# Altium footprint library LongMen.PcbLib: 245 footprints (part 7 of 16)
Each footprint in its own frame and in the unit in brackets; x right, y up, seen from the top. Pads: shape width x height; smd on the part's side, far side on the other; paste and mask are expansions set on the pad; w line width, h text height; cw(c..) or ccw(c..) is an arc to the next point about the centre after c.
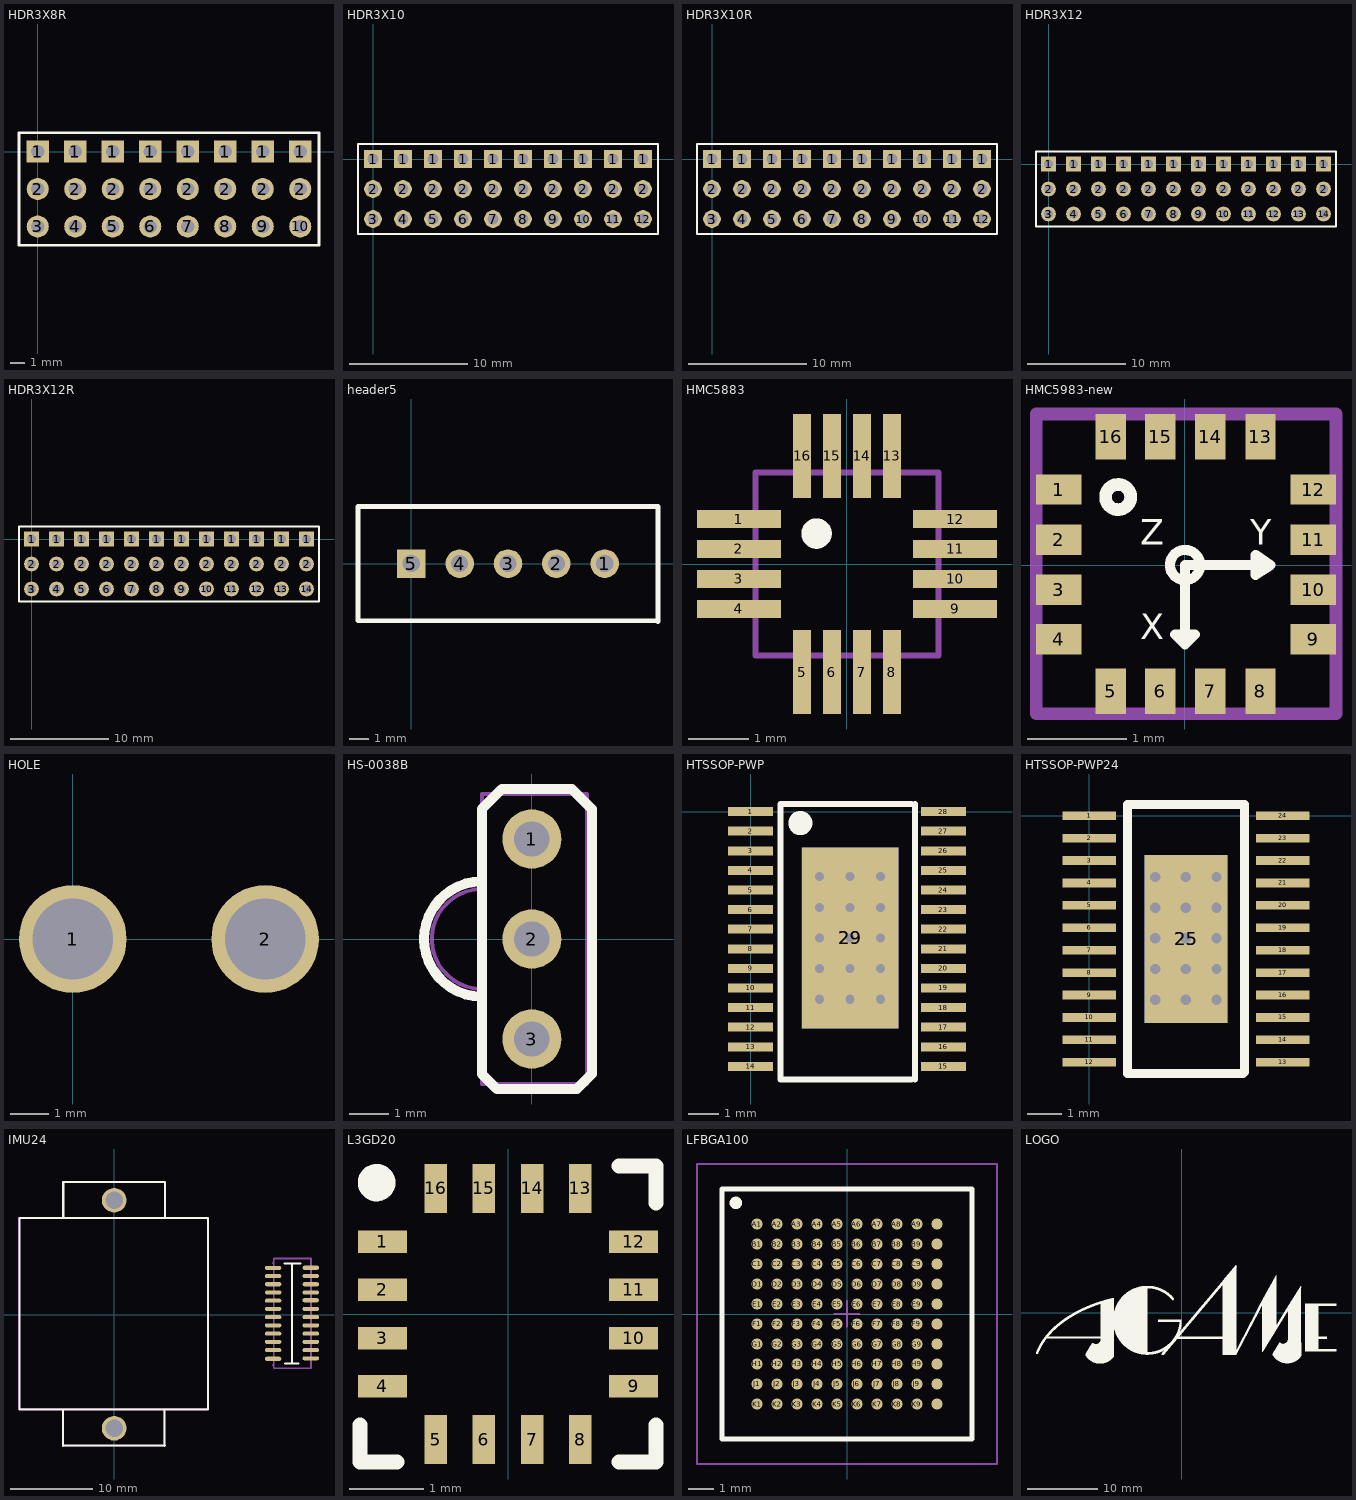
[diagram p6: the footprints below, top view; thin cyan lines are the x and y axes]

## HDR3X8R [mm]
pads (24):
  rect 1.5x1.5 hole 0.9: 1(0,0) 1(2.54,0) 1(5.08,0) 1(7.62,0) 1(10.16,0) 1(12.7,0) 1(15.24,0) 1(17.78,0)
  round 1.5 hole 0.9: 2(0,-2.54) 2(2.54,-2.54) 2(5.08,-2.54) 2(7.62,-2.54) 2(10.16,-2.54) 2(12.7,-2.54) 2(15.24,-2.54) 2(17.78,-2.54) 3(0,-5.08) 4(2.54,-5.08) 5(5.08,-5.08) 6(7.62,-5.08) 7(10.16,-5.08) 8(12.7,-5.08) 9(15.24,-5.08) 10(17.78,-5.08)
Top Overlay:
  lines w0.2: -1.27,-6.35 19.05,-6.35 19.05,1.27 -1.27,1.27 -1.27,-6.35
Mechanical 16:
  lines w0.1: -0.3,-5.38 -0.3,-4.78 0.3,-4.78 0.3,-5.38 -0.3,-5.38 ; -0.3,-2.84 -0.3,-2.24 0.3,-2.24 0.3,-2.84 -0.3,-2.84 ; -0.3,-0.3 0.3,-0.3 0.3,0.3 -0.3,0.3 -0.3,-0.3 ; 2.24,-5.38 2.24,-4.78 2.84,-4.78 2.84,-5.38 2.24,-5.38 ; 2.24,-2.84 2.24,-2.24 2.84,-2.24 2.84,-2.84 2.24,-2.84 ; 2.24,-0.3 2.24,0.3 2.84,0.3 2.84,-0.3 2.24,-0.3 ; 4.78,-5.38 5.38,-5.38 5.38,-4.78 4.78,-4.78 4.78,-5.38 ; 4.78,-2.84 5.38,-2.84 5.38,-2.24 4.78,-2.24 4.78,-2.84 ; 4.78,-0.3 4.78,0.3 5.38,0.3 5.38,-0.3 4.78,-0.3 ; 7.32,-5.38 7.92,-5.38 7.92,-4.78 7.32,-4.78 7.32,-5.38 ; 7.32,-2.84 7.92,-2.84 7.92,-2.24 7.32,-2.24 7.32,-2.84 ; 7.32,-0.3 7.32,0.3 7.92,0.3 7.92,-0.3 7.32,-0.3 ; 9.86,-5.38 10.46,-5.38 10.46,-4.78 9.86,-4.78 9.86,-5.38 ; 9.86,-2.84 10.46,-2.84 10.46,-2.24 9.86,-2.24 9.86,-2.84 ; 9.86,-0.3 9.86,0.3 10.46,0.3 10.46,-0.3 9.86,-0.3 ; 12.4,-5.38 13,-5.38 13,-4.78 12.4,-4.78 12.4,-5.38 ; 12.4,-2.84 13,-2.84 13,-2.24 12.4,-2.24 12.4,-2.84 ; 12.4,-0.3 13,-0.3 13,0.3 12.4,0.3 12.4,-0.3 ; 14.94,-5.38 14.94,-4.78 15.54,-4.78 15.54,-5.38 14.94,-5.38 ; 14.94,-2.84 14.94,-2.24 15.54,-2.24 15.54,-2.84 14.94,-2.84 ; 14.94,-0.3 15.54,-0.3 15.54,0.3 14.94,0.3 14.94,-0.3 ; 17.48,-5.38 17.48,-4.78 18.08,-4.78 18.08,-5.38 17.48,-5.38 ; 17.48,-2.84 17.48,-2.24 18.08,-2.24 18.08,-2.84 17.48,-2.84 ; 17.48,-0.3 18.08,-0.3 18.08,0.3 17.48,0.3 17.48,-0.3
3D body: height 7.59, standoff -3, extent -1.27,-5.4 19.05,9.81

## HDR3X10 [mm]
pads (31):
  rect 1.5x1.5 hole 0.9: 1(0,0) 1(2.54,0) 1(5.08,0) 1(7.62,0) 1(10.16,0) 1(12.7,0) 1(15.24,0) 1(17.78,0) 1(20.32,0) 1(22.86,0)
  round 1.5 hole 0.9: 2(0,-2.54) 2(2.54,-2.54) 2(5.08,-2.54) 2(7.62,-2.54) 2(10.16,-2.54) 2(12.7,-2.54) 2(15.24,-2.54) 2(17.78,-2.54) 2(20.32,-2.54) 2(22.86,-2.54) 3(0,-5.08) 3(0,-5.08) 4(2.54,-5.08) 5(5.08,-5.08) 6(7.62,-5.08) 7(10.16,-5.08) 8(12.7,-5.08) 9(15.24,-5.08) 10(17.78,-5.08) 11(20.32,-5.08) 12(22.86,-5.08)
Top Overlay:
  lines w0.2: -1.27,-6.35 24.13,-6.35 24.13,1.27 -1.27,1.27 -1.27,-6.35
Mechanical 16:
  lines w0.1: -0.3,-5.38 -0.3,-4.78 0.3,-4.78 0.3,-5.38 -0.3,-5.38 ; -0.3,-2.84 -0.3,-2.24 0.3,-2.24 0.3,-2.84 -0.3,-2.84 ; -0.3,-0.3 0.3,-0.3 0.3,0.3 -0.3,0.3 -0.3,-0.3 ; 2.24,-5.38 2.24,-4.78 2.84,-4.78 2.84,-5.38 2.24,-5.38 ; 2.24,-2.84 2.24,-2.24 2.84,-2.24 2.84,-2.84 2.24,-2.84 ; 2.24,-0.3 2.24,0.3 2.84,0.3 2.84,-0.3 2.24,-0.3 ; 4.78,-5.38 4.78,-4.78 5.38,-4.78 5.38,-5.38 4.78,-5.38 ; 4.78,-2.84 4.78,-2.24 5.38,-2.24 5.38,-2.84 4.78,-2.84 ; 4.78,-0.3 4.78,0.3 5.38,0.3 5.38,-0.3 4.78,-0.3 ; 7.32,-5.38 7.32,-4.78 7.92,-4.78 7.92,-5.38 7.32,-5.38 ; 7.32,-2.84 7.32,-2.24 7.92,-2.24 7.92,-2.84 7.32,-2.84 ; 7.32,-0.3 7.32,0.3 7.92,0.3 7.92,-0.3 7.32,-0.3 ; 9.86,-5.38 9.86,-4.78 10.46,-4.78 10.46,-5.38 9.86,-5.38 ; 9.86,-2.84 9.86,-2.24 10.46,-2.24 10.46,-2.84 9.86,-2.84 ; 9.86,-0.3 9.86,0.3 10.46,0.3 10.46,-0.3 9.86,-0.3 ; 12.4,-5.38 12.4,-4.78 13,-4.78 13,-5.38 12.4,-5.38 ; 12.4,-2.84 12.4,-2.24 13,-2.24 13,-2.84 12.4,-2.84 ; 12.4,-0.3 12.4,0.3 13,0.3 13,-0.3 12.4,-0.3 ; 14.94,-5.38 14.94,-4.78 15.54,-4.78 15.54,-5.38 14.94,-5.38 ; 14.94,-2.84 14.94,-2.24 15.54,-2.24 15.54,-2.84 14.94,-2.84 ; 14.94,-0.3 14.94,0.3 15.54,0.3 15.54,-0.3 14.94,-0.3 ; 17.48,-5.38 17.48,-4.78 18.08,-4.78 18.08,-5.38 17.48,-5.38 ; 17.48,-2.84 17.48,-2.24 18.08,-2.24 18.08,-2.84 17.48,-2.84 ; 17.48,-0.3 17.48,0.3 18.08,0.3 18.08,-0.3 17.48,-0.3 ; 20.02,-5.38 20.02,-4.78 20.62,-4.78 20.62,-5.38 20.02,-5.38 ; 20.02,-2.84 20.02,-2.24 20.62,-2.24 20.62,-2.84 20.02,-2.84 ; 20.02,-0.3 20.02,0.3 20.62,0.3 20.62,-0.3 20.02,-0.3 ; 22.56,-5.38 22.56,-4.78 23.16,-4.78 23.16,-5.38 22.56,-5.38 ; 22.56,-2.84 22.56,-2.24 23.16,-2.24 23.16,-2.84 22.56,-2.84 ; 22.56,-0.3 22.56,0.3 23.16,0.3 23.16,-0.3 22.56,-0.3
3D body: height 8.54, standoff -3, extent -1.27,-6.325 24.13,1.245

## HDR3X10R [mm]
pads (31):
  rect 1.5x1.5 hole 0.9: 1(0,0) 1(2.54,0) 1(5.08,0) 1(7.62,0) 1(10.16,0) 1(12.7,0) 1(15.24,0) 1(17.78,0) 1(20.32,0) 1(22.86,0)
  round 1.5 hole 0.9: 2(0,-2.54) 2(2.54,-2.54) 2(5.08,-2.54) 2(7.62,-2.54) 2(10.16,-2.54) 2(12.7,-2.54) 2(15.24,-2.54) 2(17.78,-2.54) 2(20.32,-2.54) 2(22.86,-2.54) 3(0,-5.08) 3(0,-5.08) 4(2.54,-5.08) 5(5.08,-5.08) 6(7.62,-5.08) 7(10.16,-5.08) 8(12.7,-5.08) 9(15.24,-5.08) 10(17.78,-5.08) 11(20.32,-5.08) 12(22.86,-5.08)
Top Overlay:
  lines w0.2: -1.27,-6.35 24.13,-6.35 24.13,1.27 -1.27,1.27 -1.27,-6.35
Mechanical 16:
  lines w0.1: -0.3,-5.38 -0.3,-4.78 0.3,-4.78 0.3,-5.38 -0.3,-5.38 ; -0.3,-2.84 -0.3,-2.24 0.3,-2.24 0.3,-2.84 -0.3,-2.84 ; -0.3,-0.3 0.3,-0.3 0.3,0.3 -0.3,0.3 -0.3,-0.3 ; 2.24,-5.38 2.24,-4.78 2.84,-4.78 2.84,-5.38 2.24,-5.38 ; 2.24,-2.84 2.24,-2.24 2.84,-2.24 2.84,-2.84 2.24,-2.84 ; 2.24,-0.3 2.24,0.3 2.84,0.3 2.84,-0.3 2.24,-0.3 ; 4.78,-5.38 4.78,-4.78 5.38,-4.78 5.38,-5.38 4.78,-5.38 ; 4.78,-2.84 4.78,-2.24 5.38,-2.24 5.38,-2.84 4.78,-2.84 ; 4.78,-0.3 4.78,0.3 5.38,0.3 5.38,-0.3 4.78,-0.3 ; 7.32,-5.38 7.32,-4.78 7.92,-4.78 7.92,-5.38 7.32,-5.38 ; 7.32,-2.84 7.32,-2.24 7.92,-2.24 7.92,-2.84 7.32,-2.84 ; 7.32,-0.3 7.32,0.3 7.92,0.3 7.92,-0.3 7.32,-0.3 ; 9.86,-5.38 9.86,-4.78 10.46,-4.78 10.46,-5.38 9.86,-5.38 ; 9.86,-2.84 9.86,-2.24 10.46,-2.24 10.46,-2.84 9.86,-2.84 ; 9.86,-0.3 9.86,0.3 10.46,0.3 10.46,-0.3 9.86,-0.3 ; 12.4,-5.38 12.4,-4.78 13,-4.78 13,-5.38 12.4,-5.38 ; 12.4,-2.84 12.4,-2.24 13,-2.24 13,-2.84 12.4,-2.84 ; 12.4,-0.3 12.4,0.3 13,0.3 13,-0.3 12.4,-0.3 ; 14.94,-5.38 14.94,-4.78 15.54,-4.78 15.54,-5.38 14.94,-5.38 ; 14.94,-2.84 14.94,-2.24 15.54,-2.24 15.54,-2.84 14.94,-2.84 ; 14.94,-0.3 14.94,0.3 15.54,0.3 15.54,-0.3 14.94,-0.3 ; 17.48,-5.38 17.48,-4.78 18.08,-4.78 18.08,-5.38 17.48,-5.38 ; 17.48,-2.84 17.48,-2.24 18.08,-2.24 18.08,-2.84 17.48,-2.84 ; 17.48,-0.3 17.48,0.3 18.08,0.3 18.08,-0.3 17.48,-0.3 ; 20.02,-5.38 20.02,-4.78 20.62,-4.78 20.62,-5.38 20.02,-5.38 ; 20.02,-2.84 20.02,-2.24 20.62,-2.24 20.62,-2.84 20.02,-2.84 ; 20.02,-0.3 20.02,0.3 20.62,0.3 20.62,-0.3 20.02,-0.3 ; 22.56,-5.38 22.56,-4.78 23.16,-4.78 23.16,-5.38 22.56,-5.38 ; 22.56,-2.84 22.56,-2.24 23.16,-2.24 23.16,-2.84 22.56,-2.84 ; 22.56,-0.3 22.56,0.3 23.16,0.3 23.16,-0.3 22.56,-0.3
3D body: height 7.59, standoff -3, extent -1.27,-5.4 24.13,9.81

## HDR3X12 [mm]
pads (37):
  rect 1.5x1.5 hole 0.9: 1(0,0) 1(2.54,0) 1(5.08,0) 1(7.62,0) 1(10.16,0) 1(12.7,0) 1(15.24,0) 1(17.78,0) 1(20.32,0) 1(22.86,0) 1(25.4,0) 1(27.94,0)
  round 1.5 hole 0.9: 2(0,-2.54) 2(2.54,-2.54) 2(5.08,-2.54) 2(7.62,-2.54) 2(10.16,-2.54) 2(12.7,-2.54) 2(15.24,-2.54) 2(17.78,-2.54) 2(20.32,-2.54) 2(22.86,-2.54) 2(25.4,-2.54) 2(27.94,-2.54) 3(0,-5.08) 3(0,-5.08) 4(2.54,-5.08) 5(5.08,-5.08) 6(7.62,-5.08) 7(10.16,-5.08) 8(12.7,-5.08) 9(15.24,-5.08) 10(17.78,-5.08) 11(20.32,-5.08) 12(22.86,-5.08) 13(25.4,-5.08) 14(27.94,-5.08)
Top Overlay:
  lines w0.2: -1.27,-6.35 29.21,-6.35 29.21,1.27 -1.27,1.27 -1.27,-6.35
3D body: height 8.54, standoff -3, extent -1.27,-6.325 29.21,1.245

## HDR3X12R [mm]
pads (37):
  rect 1.5x1.5 hole 0.9: 1(0,0) 1(2.54,0) 1(5.08,0) 1(7.62,0) 1(10.16,0) 1(12.7,0) 1(15.24,0) 1(17.78,0) 1(20.32,0) 1(22.86,0) 1(25.4,0) 1(27.94,0)
  round 1.5 hole 0.9: 2(0,-2.54) 2(2.54,-2.54) 2(5.08,-2.54) 2(7.62,-2.54) 2(10.16,-2.54) 2(12.7,-2.54) 2(15.24,-2.54) 2(17.78,-2.54) 2(20.32,-2.54) 2(22.86,-2.54) 2(25.4,-2.54) 2(27.94,-2.54) 3(0,-5.08) 3(0,-5.08) 4(2.54,-5.08) 5(5.08,-5.08) 6(7.62,-5.08) 7(10.16,-5.08) 8(12.7,-5.08) 9(15.24,-5.08) 10(17.78,-5.08) 11(20.32,-5.08) 12(22.86,-5.08) 13(25.4,-5.08) 14(27.94,-5.08)
Top Overlay:
  lines w0.2: -1.27,-6.35 -1.27,1.27 29.21,1.27 29.21,-6.35 -1.27,-6.35
3D body: height 7.59, standoff -3, extent -1.27,-5.4 29.21,9.81

## header5 [mm]
pads (5):
  round 1.5 hole 0.9: 1(10.16,0) 2(7.62,0) 3(5.08,0) 4(2.54,0)
  rect 1.5x1.5 hole 0.9: 5(0,0)
Top Overlay:
  lines w0.254: -2.8,3 -2.8,-3 12.918,-3 12.96,-3.042 12.96,3 -2.794,3

## HMC5883 [mm]
pads (16):
  rect 1.4x0.3 smd: 1(-1.8,0.75) 2(-1.8,0.25) 3(-1.8,-0.25) 4(-1.8,-0.75) 9(1.8,-0.75) 10(1.8,-0.25) 11(1.8,0.25) 12(1.8,0.75)
  rect 0.3x1.4 smd: 5(-0.75,-1.8) 6(-0.25,-1.8) 7(0.25,-1.8) 8(0.75,-1.8) 13(0.75,1.8) 14(0.25,1.8) 15(-0.25,1.8) 16(-0.75,1.8)
Top Overlay:
  circle w0.254: c-0.508,0.508 r0.127
Mechanical 16:
  lines w0.102: -1.524,-1.524 1.524,-1.524 1.524,1.524 -1.524,1.524 -1.524,-1.524
3D body: height 0.9, standoff -0.01, extent -1.476,-1.5 1.524,1.5

## HMC5983-new [mil] "HMC5983"
pads (16):
  rect 18x12 smd: 1(-50.2,30) 2(-50.2,10) 3(-50.2,-9.84) 4(-50.2,-29.53) 9(51,-29.53) 10(51,-9.84) 11(51,10) 12(51,30)
  rect 12x18 smd: 5(-29.53,-50.2) 6(-9.84,-50.2) 7(10,-50.2) 8(30,-50.2) 13(30,51) 14(10,51) 15(-9.84,51) 16(-29.53,51)
Top Overlay:
  circle w4: c0,0 r6
  circle w5: c-26.57,27 r5
  lines w4: 0,-31.5 -3.94,-27.56 4,-27.56 0,-31.5 ; 0,-31.5 0,0 34,0 ; 34,0 28,-3.94 28,4 34,0
  text "Z" at -17.72,8 h10.2
  text "Y" at 26,8 h10.2
  text "X" at -17.72,-29.53 h10.2
Mechanical 16:
  lines w5: -59.06,-59.06 -59.06,60 ; -59.06,-59.06 60,-59.06 ; -59.06,-59.06 -59.06,60 ; -59.06,-59.06 60,-59.06 ; -59.06,60 60,60 ; -59.06,60 60,60 ; 60,-59.06 60,60 ; 60,-59.06 60,60
3D body: height 35.43, standoff 0, extent -59,-58.88 60.77,60.88

## HOLE [mm]
pads (2):
  round 2.8 hole 2.1: 1(0,0) 2(5,0)

## HS-0038B [mm]
pads (3):
  round 1.5 hole 0.9: 1(0,2.54) 2(0,0) 3(0,-2.54)
Top Overlay:
  lines w0.254: -1.27,-1.466 cw(c-1.27,0) -1.27,1.466 ; -1.27,-3.429 -1.27,3.302 -0.762,3.81 1.016,3.81 1.524,3.302 1.524,-3.429 1.143,-3.81 -0.889,-3.81 -1.27,-3.429
Mechanical 15:
  lines w0.1: -1.27,-3.683 -1.27,-1.27 cw(c-1.27,0) -1.27,1.27 -1.27,3.683 1.397,3.683 1.397,-3.683 -1.27,-3.683
Mechanical 16:
  lines w0.1: -0.302,-2.84 0.298,-2.84 0.298,-2.24 -0.302,-2.24 -0.302,-2.84 ; -0.302,-0.3 0.298,-0.3 0.298,0.3 -0.302,0.3 -0.302,-0.3 ; -0.302,2.24 0.298,2.24 0.298,2.84 -0.302,2.84 -0.302,2.24
3D body: height 10, standoff 5, extent -2.551,-3.684 1.398,3.684
3D body: height 5, standoff -2, extent -0.301,2.241 0.297,2.839
3D body: height 5, standoff -2, extent -0.301,-0.299 0.297,0.299
3D body: height 5, standoff -2, extent -0.301,-2.839 0.297,-2.241

## HTSSOP-PWP [mm] "DRV8313封装"
height 1.2
pads (30):
  rect 1.5x0.3 smd: 1(0,0) 2(0,-0.65) 3(0,-1.3) 4(0,-1.95) 5(0,-2.6) 6(0,-3.25) 7(0,-3.9) 8(0,-4.55) 9(0,-5.2) 10(0,-5.85) 11(0,-6.5) 12(0,-7.15) 13(0,-7.8) 14(0,-8.45) 15(6.4,-8.45) 16(6.4,-7.8) 17(6.4,-7.15) 18(6.4,-6.5) 19(6.4,-5.85) 20(6.4,-5.2) 21(6.4,-4.55) 22(6.4,-3.9) 23(6.4,-3.25) 24(6.4,-2.6) 25(6.4,-1.95) 26(6.4,-1.3) 27(6.4,-0.65) 28(6.4,0)
  rect 3.2x6 smd: 29(3.302,-4.191)
  rect 3.2x6 smd far side: 29(3.302,-4.191)
via 2.286,-2.159 diameter 0.6 hole 0.3
via 4.318,-2.159 diameter 0.6 hole 0.3
via 3.302,-2.159 diameter 0.6 hole 0.3
via 4.318,-3.175 diameter 0.6 hole 0.3
via 2.286,-3.175 diameter 0.6 hole 0.3
via 4.318,-4.191 diameter 0.6 hole 0.3
via 2.286,-4.191 diameter 0.6 hole 0.3
via 2.286,-6.223 diameter 0.6 hole 0.3
via 2.286,-5.207 diameter 0.6 hole 0.3
via 4.318,-6.223 diameter 0.6 hole 0.3
via 4.318,-5.207 diameter 0.6 hole 0.3
via 3.302,-6.223 diameter 0.6 hole 0.3
via 3.302,-5.207 diameter 0.6 hole 0.3
via 3.302,-3.175 diameter 0.6 hole 0.3
via 3.302,-4.191 diameter 0.6 hole 0.3
Top Overlay:
  circle w0.4: c1.651,-0.381 r0.2
  lines w0.2: 1,0.254 1,-8.89 5.334,-8.89 ; 1.016,0.254 5.334,0.254 ; 5.45,-8.89 5.45,0.254
3D body: height 1.2, standoff 0, extent 0.9,-8.99 5.55,0.354

## HTSSOP-PWP24 [mm]
height 1.2
pads (26):
  rect 1.55x0.25 smd: 1(0,0) 2(0,-0.65) 3(0,-1.3) 4(0,-1.95) 5(0,-2.6) 6(0,-3.25) 7(0,-3.9) 8(0,-4.55) 9(0,-5.2) 10(0,-5.85) 11(0,-6.5) 12(0,-7.15) 13(5.6,-7.15) 14(5.6,-6.5) 15(5.6,-5.85) 16(5.6,-5.2) 17(5.6,-4.55) 18(5.6,-3.9) 19(5.6,-3.25) 20(5.6,-2.6) 21(5.6,-1.95) 22(5.6,-1.3) 23(5.6,-0.65) 24(5.6,0)
  rect 2.4x4.87 smd: 25(2.8,-3.575)
  rect 2.4x4.87 smd far side: 25(2.8,-3.575)
via 3.683,-3.556 diameter 0.6 hole 0.3
via 1.905,-3.556 diameter 0.6 hole 0.3
via 2.794,-3.556 diameter 0.6 hole 0.3
via 1.905,-4.445 diameter 0.6 hole 0.3
via 2.794,-4.445 diameter 0.6 hole 0.3
via 3.683,-4.445 diameter 0.6 hole 0.3
via 3.683,-5.334 diameter 0.6 hole 0.3
via 2.794,-5.334 diameter 0.6 hole 0.3
via 1.905,-5.334 diameter 0.6 hole 0.3
via 1.905,-2.667 diameter 0.6 hole 0.3
via 2.794,-2.667 diameter 0.6 hole 0.3
via 3.683,-2.667 diameter 0.6 hole 0.3
via 3.683,-1.778 diameter 0.6 hole 0.3
via 2.794,-1.778 diameter 0.6 hole 0.3
via 1.905,-1.778 diameter 0.6 hole 0.3
Top Overlay:
  lines w0.254: 4.463,-7.475 1.1,-7.475 1.1,0.325 4.5,0.325 4.5,-7.438
3D body: height 1.2, standoff 0, extent 0.973,-7.602 4.627,0.452

## IMU24 [mm]
pads (26):
  oval 2x0.5 smd: 1(23.879,5.727) 2(19.301,5.718) 3(23.879,4.727) 4(19.301,4.702) 5(23.879,3.727) 6(19.307,3.727) 7(23.879,2.727) 8(19.307,2.727) 9(23.873,1.781) 10(19.307,1.727) 11(23.879,0.727) 12(19.307,0.727) 13(23.879,-0.273) 14(19.307,-0.273) 15(23.879,-1.273) 16(19.307,-1.273) 17(23.879,-2.273) 18(19.307,-2.273) 19(23.879,-3.273) 20(19.307,-3.273) 21(23.879,-4.273) 22(19.307,-4.273) 23(23.879,-5.273) 24(19.301,-5.331)
  round 3 hole 2.15: ""(0,-13.776) ""(0,13.924)
Top Overlay:
  lines w0.254: -6.223,-15.914 -6.223,-11.557 ; -6.223,-15.875 6.141,-15.875 ; -6.182,11.774 -6.182,16.131 6.182,16.131 6.182,11.792 ; 6.096,-15.896 6.096,-11.557 ; 11.287,11.774 -11.513,11.774 -11.513,-11.469 11.414,-11.469 11.414,11.747 ; 20.67,6.235 22.609,6.235 ; 20.748,-5.889 22.399,-5.889 ; 21.587,-5.788 21.593,6.235
Mechanical 13:
  lines w0.2: -11.557,-11.303 -11.43,-11.43 ; 11.303,11.684 11.43,11.557 ; 23.809,-6.477 19.4,-6.477 19.4,6.858 23.9,6.858 23.9,-6.477
Mechanical 15:
  lines w0.2: 19.273,-6.096 19.4,-5.969 ; 19.273,6.35 19.4,6.223 ; -11.557,-11.43 11.43,-11.43 11.43,11.684 11.303,11.811 -11.557,11.811 -11.557,-11.43
Mechanical 16:
  lines w0.2: 11.43,-5.461 11.43,6.731 ; -6.223,-15.875 -6.223,-11.43 6.096,-11.43 6.096,-15.875 -6.223,-15.875 ; -6.223,11.811 -6.223,16.129 6.096,16.129 6.223,16.002 6.223,11.938 6.096,11.811 -6.223,11.811
3D body: height 23.26, standoff -0.01, extent -11.223,-15.723 25.317,15.977

## L3GD20 [mm] "4x4x1"
pads (16):
  rect 0.66x0.305 smd mask+0: 1(-1.7,0.975) 2(-1.7,0.325) 3(-1.7,-0.325) 4(-1.7,-0.975) 9(1.7,-0.975) 10(1.7,-0.325) 11(1.7,0.325) 12(1.7,0.975)
  rect 0.305x0.66 smd mask+0: 5(-0.975,-1.7) 6(-0.325,-1.7) 7(0.325,-1.7) 8(0.975,-1.7) 13(0.975,1.7) 14(0.325,1.7) 15(-0.325,1.7) 16(-0.975,1.7)
Top Overlay:
  circle w0.254: c-1.778,1.778 r0.127
  lines w0.203: -2,-1.5 -2,-2 -1.5,-2 ; 1.5,-2 2,-2 2,-1.5 ; 1.5,2 2,2 2,1.5
3D body: height 0.98, standoff 0, extent -2,-2 2,2

## LFBGA100 [mm] "BGA, 100-Leads, Body 10x10mm, Pitch 0.8mm"
height 1.7
pads (100):
  round 0.45 smd: A1(-3.6,3.6) A2(-2.8,3.6) A3(-2,3.6) A4(-1.2,3.6) A5(-0.4,3.6) A6(0.4,3.6) A7(1.2,3.6) A8(2,3.6) A9(2.8,3.6) A10(3.6,3.6) B1(-3.6,2.8) B2(-2.8,2.8) B3(-2,2.8) B4(-1.2,2.8) B5(-0.4,2.8) B6(0.4,2.8) B7(1.2,2.8) B8(2,2.8) B9(2.8,2.8) B10(3.6,2.8) C1(-3.6,2) C2(-2.8,2) C3(-2,2) C4(-1.2,2) C5(-0.4,2) C6(0.4,2) C7(1.2,2) C8(2,2) C9(2.8,2) C10(3.6,2) D1(-3.6,1.2) D2(-2.8,1.2) D3(-2,1.2) D4(-1.2,1.2) D5(-0.4,1.2) D6(0.4,1.2) D7(1.2,1.2) D8(2,1.2) D9(2.8,1.2) D10(3.6,1.2) E1(-3.6,0.4) E2(-2.8,0.4) E3(-2,0.4) E4(-1.2,0.4) E5(-0.4,0.4) E6(0.4,0.4) E7(1.2,0.4) E8(2,0.4) E9(2.8,0.4) E10(3.6,0.4) F1(-3.6,-0.4) F2(-2.8,-0.4) F3(-2,-0.4) F4(-1.2,-0.4) F5(-0.4,-0.4) F6(0.4,-0.4) F7(1.2,-0.4) F8(2,-0.4) F9(2.8,-0.4) F10(3.6,-0.4) G1(-3.6,-1.2) G2(-2.8,-1.2) G3(-2,-1.2) G4(-1.2,-1.2) G5(-0.4,-1.2) G6(0.4,-1.2) G7(1.2,-1.2) G8(2,-1.2) G9(2.8,-1.2) G10(3.6,-1.2) H1(-3.6,-2) H2(-2.8,-2) H3(-2,-2) H4(-1.2,-2) H5(-0.4,-2) H6(0.4,-2) H7(1.2,-2) H8(2,-2) H9(2.8,-2) H10(3.6,-2) J1(-3.6,-2.8) J2(-2.8,-2.8) J3(-2,-2.8) J4(-1.2,-2.8) J5(-0.4,-2.8) J6(0.4,-2.8) J7(1.2,-2.8) J8(2,-2.8) J9(2.8,-2.8) J10(3.6,-2.8) K1(-3.6,-3.6) K2(-2.8,-3.6) K3(-2,-3.6) K4(-1.2,-3.6) K5(-0.4,-3.6) K6(0.4,-3.6) K7(1.2,-3.6) K8(2,-3.6) K9(2.8,-3.6) K10(3.6,-3.6)
Top Overlay:
  circle w0.25: c-4.445,4.445 r0.125
  lines w0.2: -5,-5 -5,5 5,5 5,-5 -5,-5
Mechanical 13:
  lines w0.1: -5,-5 -5,5 5,5 5,-5 -5,-5
Mechanical 15:
  lines w0.1: -0.5,0 0.5,0 ; 0,-0.5 0,0.5 ; -6,-6 -6,6 6,6 6,-6 -6,-6
3D body: height 1.7, standoff 0, extent -5,-5 5,5

## LOGO [mm]
Top Overlay:
  drawing of 8748 lines, arcs and shapes, not listed